# Altium schematic symbol library Блоки трансформаторов импульсных.SCHLIB: 325 symbols (part 1 of 2) (continued)
## БТИ3-66 (continued)
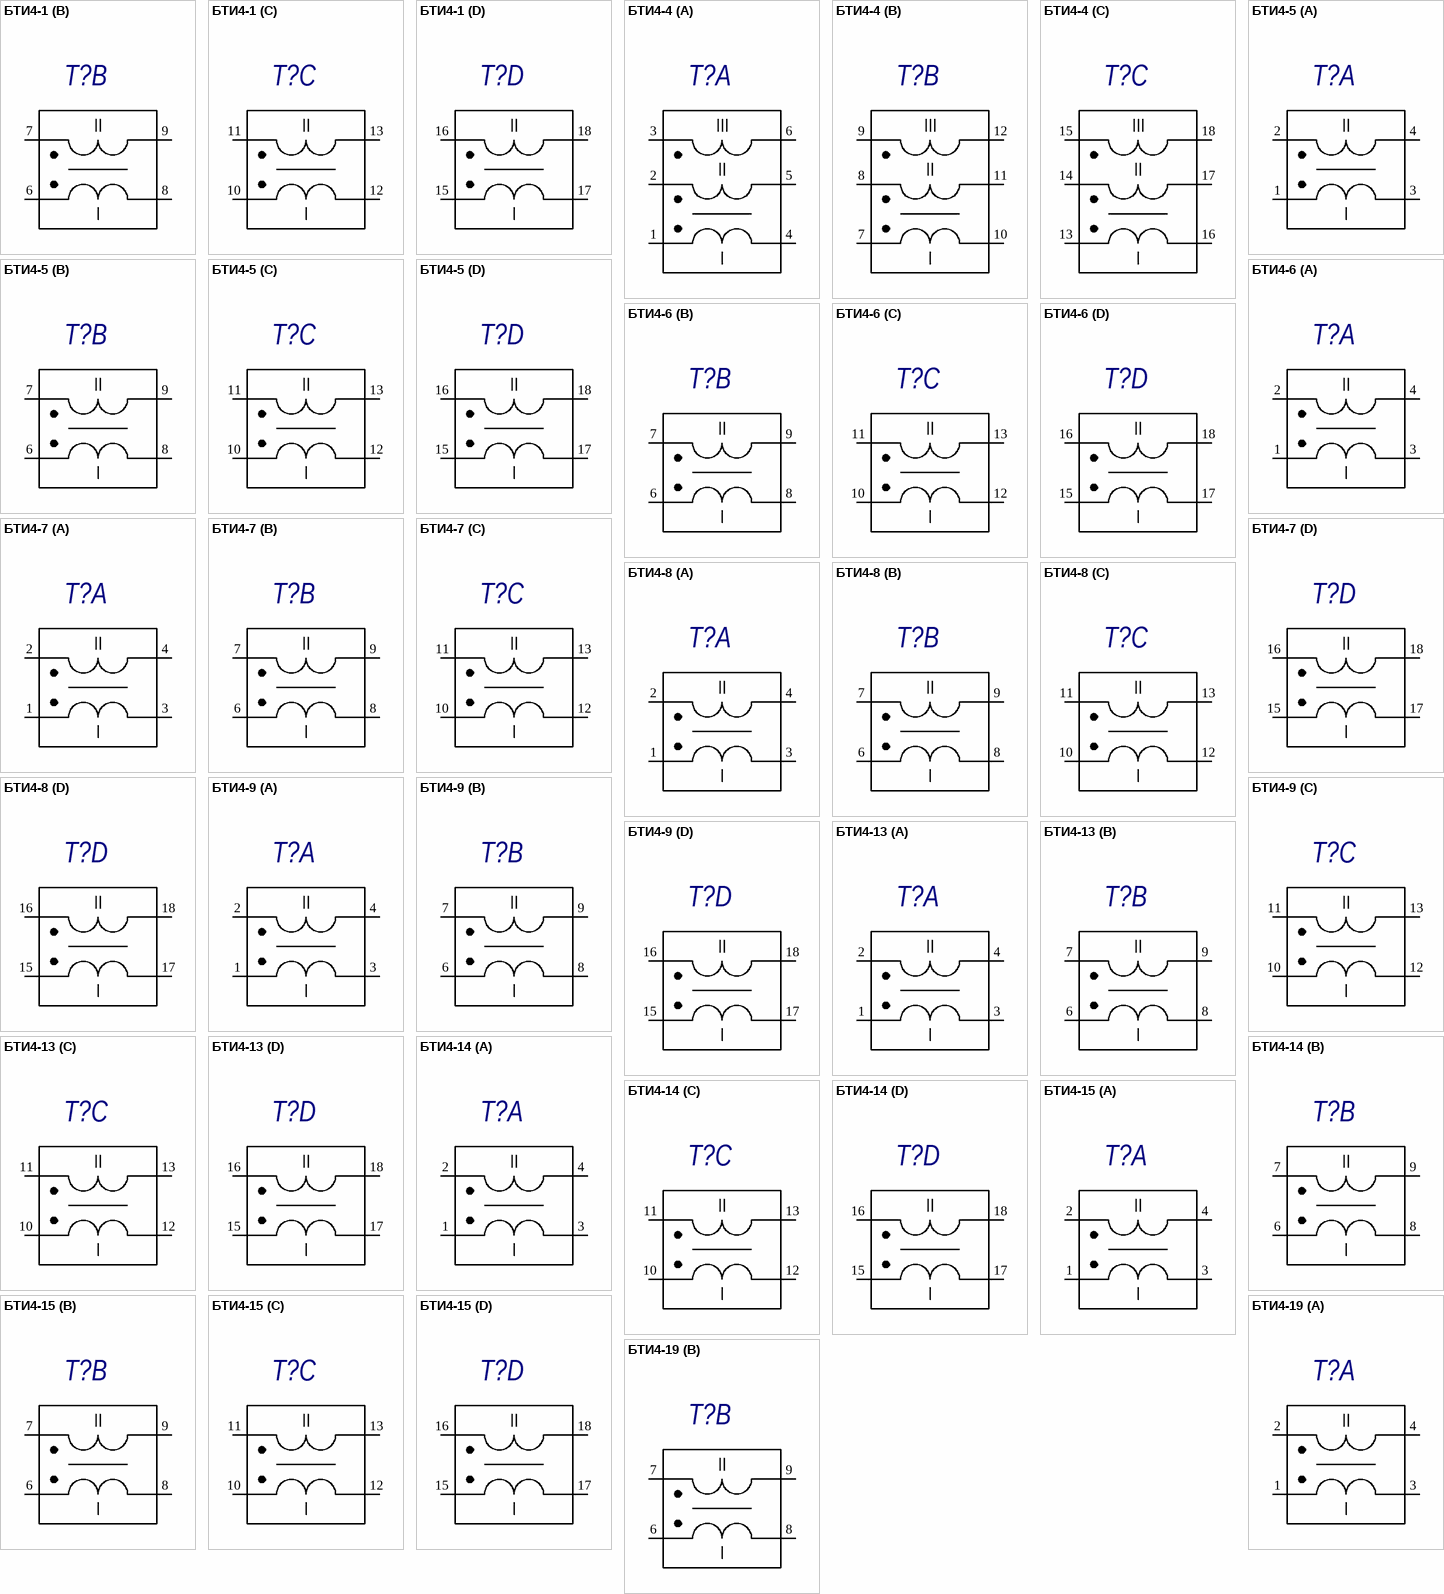
[diagram p11: symbols БТИ4-1 to БТИ4-19]
part A text: III; II; I
part B text: III; II; I
part C text: III; II; I
part D text: III; II; I

## БТИ4-1
designator T?
БТИ4; Manufacturer: ПАО  «МСТАТОР»; ManufacturerCountry: Россия; Value: {Value}; Наименование элемента: Дроссель; Category: Трансформатор; ComponentLink1Description: Manufacturer Link
footprint БТИ4
part A pins: 1, 2, 3, 4
part B pins: 6, 7, 8, 9
part C pins: 10, 11, 12, 13
part D pins: 15, 16, 17, 18 8
part A text: II; I
part B text: II; I
part C text: II; I
part D text: II; I

## БТИ4-4
designator T?
БТИ4; Manufacturer: ПАО  «МСТАТОР»; ManufacturerCountry: Россия; Value: {Value}; Наименование элемента: Дроссель; Category: Трансформатор; ComponentLink1Description: Manufacturer Link
footprint БТИ4
part A pins: 1, 2, 3, 4, 5, 6
part B pins: 7, 8, 9, 10, 11, 12
part C pins: 13, 14, 15, 16, 17, 18
part A text: III; II; I
part B text: III; II; I
part C text: III; II; I

## БТИ4-5
designator T?
БТИ4; Manufacturer: ПАО  «МСТАТОР»; ManufacturerCountry: Россия; Value: {Value}; Наименование элемента: Дроссель; Category: Трансформатор; ComponentLink1Description: Manufacturer Link
footprint БТИ4
part A pins: 1, 2, 3, 4
part B pins: 6, 7, 8, 9
part C pins: 10, 11, 12, 13
part D pins: 15, 16, 17, 18 8
part A text: II; I
part B text: II; I
part C text: II; I
part D text: II; I

## БТИ4-6
designator T?
БТИ4; Manufacturer: ПАО  «МСТАТОР»; ManufacturerCountry: Россия; Value: {Value}; Наименование элемента: Дроссель; Category: Трансформатор; ComponentLink1Description: Manufacturer Link
footprint БТИ4
part A pins: 1, 2, 3, 4
part B pins: 6, 7, 8, 9
part C pins: 10, 11, 12, 13
part D pins: 15, 16, 17, 18 8
part A text: II; I
part B text: II; I
part C text: II; I
part D text: II; I

## БТИ4-7
designator T?
БТИ4; Manufacturer: ПАО  «МСТАТОР»; ManufacturerCountry: Россия; Value: {Value}; Наименование элемента: Дроссель; Category: Трансформатор; ComponentLink1Description: Manufacturer Link
footprint БТИ4
part A pins: 1, 2, 3, 4
part B pins: 6, 7, 8, 9
part C pins: 10, 11, 12, 13
part D pins: 15, 16, 17, 18 8
part A text: II; I
part B text: II; I
part C text: II; I
part D text: II; I

## БТИ4-8
designator T?
БТИ4; Manufacturer: ПАО  «МСТАТОР»; ManufacturerCountry: Россия; Value: {Value}; Наименование элемента: Дроссель; Category: Трансформатор; ComponentLink1Description: Manufacturer Link
footprint БТИ4
part A pins: 1, 2, 3, 4
part B pins: 6, 7, 8, 9
part C pins: 10, 11, 12, 13
part D pins: 15, 16, 17, 18 8
part A text: II; I
part B text: II; I
part C text: II; I
part D text: II; I

## БТИ4-9
designator T?
БТИ4; Manufacturer: ПАО  «МСТАТОР»; ManufacturerCountry: Россия; Value: {Value}; Наименование элемента: Дроссель; Category: Трансформатор; ComponentLink1Description: Manufacturer Link
footprint БТИ4
part A pins: 1, 2, 3, 4
part B pins: 6, 7, 8, 9
part C pins: 10, 11, 12, 13
part D pins: 15, 16, 17, 18 8
part A text: II; I
part B text: II; I
part C text: II; I
part D text: II; I

## БТИ4-13
designator T?
БТИ4; Manufacturer: ПАО  «МСТАТОР»; ManufacturerCountry: Россия; Value: {Value}; Наименование элемента: Дроссель; Category: Трансформатор; ComponentLink1Description: Manufacturer Link
footprint БТИ4
part A pins: 1, 2, 3, 4
part B pins: 6, 7, 8, 9
part C pins: 10, 11, 12, 13
part D pins: 15, 16, 17, 18 8
part A text: II; I
part B text: II; I
part C text: II; I
part D text: II; I

## БТИ4-14
designator T?
БТИ4; Manufacturer: ПАО  «МСТАТОР»; ManufacturerCountry: Россия; Value: {Value}; Наименование элемента: Дроссель; Category: Трансформатор; ComponentLink1Description: Manufacturer Link
footprint БТИ4
part A pins: 1, 2, 3, 4
part B pins: 6, 7, 8, 9
part C pins: 10, 11, 12, 13
part D pins: 15, 16, 17, 18 8
part A text: II; I
part B text: II; I
part C text: II; I
part D text: II; I

## БТИ4-15
designator T?
БТИ4; Manufacturer: ПАО  «МСТАТОР»; ManufacturerCountry: Россия; Value: {Value}; Наименование элемента: Дроссель; Category: Трансформатор; ComponentLink1Description: Manufacturer Link
footprint БТИ4
part A pins: 1, 2, 3, 4
part B pins: 6, 7, 8, 9
part C pins: 10, 11, 12, 13
part D pins: 15, 16, 17, 18 8
part A text: II; I
part B text: II; I
part C text: II; I
part D text: II; I

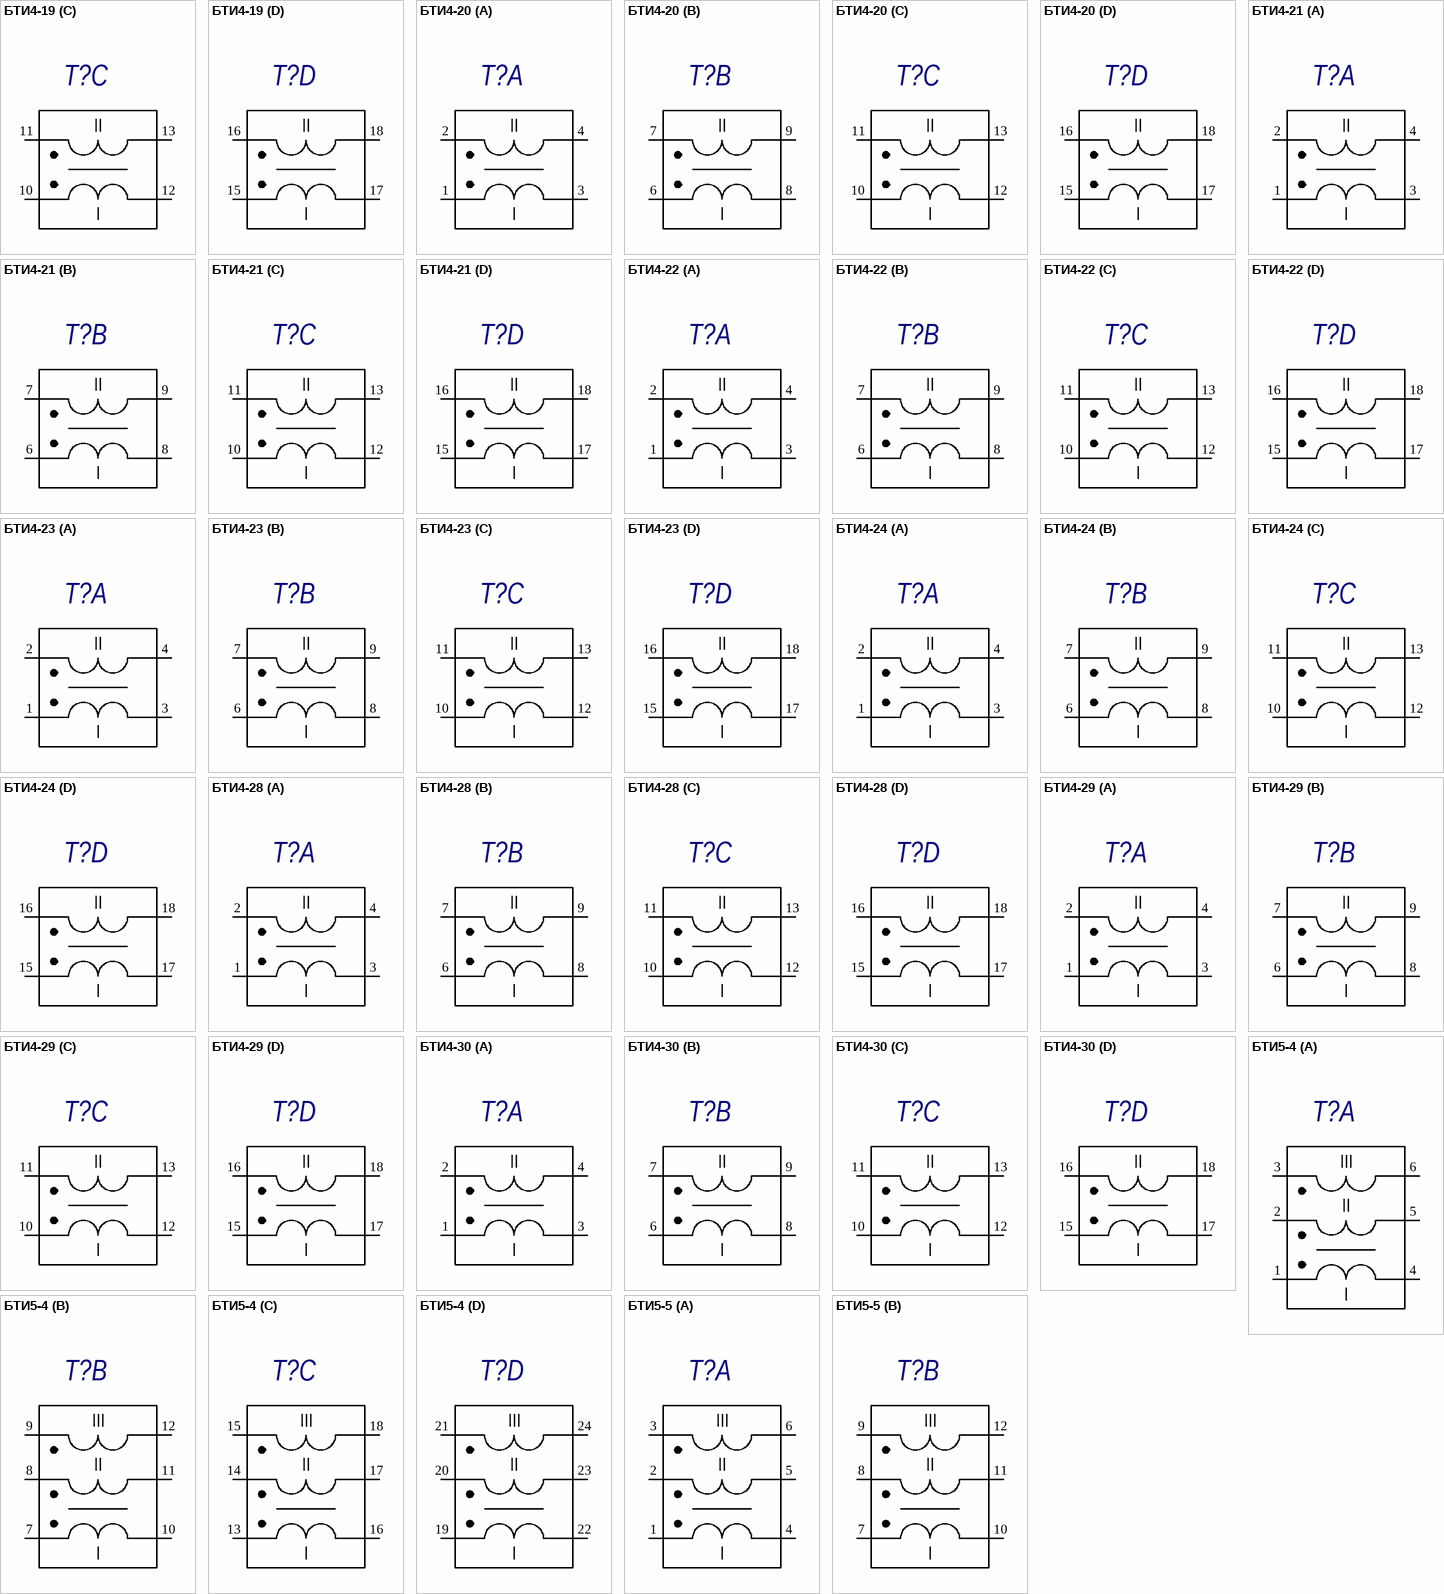
[diagram p12: symbols БТИ4-19 to БТИ5-5]

## БТИ4-19
designator T?
БТИ4; Manufacturer: ПАО  «МСТАТОР»; ManufacturerCountry: Россия; Value: {Value}; Наименование элемента: Дроссель; Category: Трансформатор; ComponentLink1Description: Manufacturer Link
footprint БТИ4
part A pins: 1, 2, 3, 4
part B pins: 6, 7, 8, 9
part C pins: 10, 11, 12, 13
part D pins: 15, 16, 17, 18 8
part A text: II; I
part B text: II; I
part C text: II; I
part D text: II; I

## БТИ4-20
designator T?
БТИ4; Manufacturer: ПАО  «МСТАТОР»; ManufacturerCountry: Россия; Value: {Value}; Наименование элемента: Дроссель; Category: Трансформатор; ComponentLink1Description: Manufacturer Link
footprint БТИ4
part A pins: 1, 2, 3, 4
part B pins: 6, 7, 8, 9
part C pins: 10, 11, 12, 13
part D pins: 15, 16, 17, 18 8
part A text: II; I
part B text: II; I
part C text: II; I
part D text: II; I

## БТИ4-21
designator T?
БТИ4; Manufacturer: ПАО  «МСТАТОР»; ManufacturerCountry: Россия; Value: {Value}; Наименование элемента: Дроссель; Category: Трансформатор; ComponentLink1Description: Manufacturer Link
footprint БТИ4
part A pins: 1, 2, 3, 4
part B pins: 6, 7, 8, 9
part C pins: 10, 11, 12, 13
part D pins: 15, 16, 17, 18 8
part A text: II; I
part B text: II; I
part C text: II; I
part D text: II; I

## БТИ4-22
designator T?
БТИ4; Manufacturer: ПАО  «МСТАТОР»; ManufacturerCountry: Россия; Value: {Value}; Наименование элемента: Дроссель; Category: Трансформатор; ComponentLink1Description: Manufacturer Link
footprint БТИ4
part A pins: 1, 2, 3, 4
part B pins: 6, 7, 8, 9
part C pins: 10, 11, 12, 13
part D pins: 15, 16, 17, 18 8
part A text: II; I
part B text: II; I
part C text: II; I
part D text: II; I

## БТИ4-23
designator T?
БТИ4; Manufacturer: ПАО  «МСТАТОР»; ManufacturerCountry: Россия; Value: {Value}; Наименование элемента: Дроссель; Category: Трансформатор; ComponentLink1Description: Manufacturer Link
footprint БТИ4
part A pins: 1, 2, 3, 4
part B pins: 6, 7, 8, 9
part C pins: 10, 11, 12, 13
part D pins: 15, 16, 17, 18 8
part A text: II; I
part B text: II; I
part C text: II; I
part D text: II; I

## БТИ4-24
designator T?
БТИ4; Manufacturer: ПАО  «МСТАТОР»; ManufacturerCountry: Россия; Value: {Value}; Наименование элемента: Дроссель; Category: Трансформатор; ComponentLink1Description: Manufacturer Link
footprint БТИ4
part A pins: 1, 2, 3, 4
part B pins: 6, 7, 8, 9
part C pins: 10, 11, 12, 13
part D pins: 15, 16, 17, 18 8
part A text: II; I
part B text: II; I
part C text: II; I
part D text: II; I

## БТИ4-28
designator T?
БТИ4; Manufacturer: ПАО  «МСТАТОР»; ManufacturerCountry: Россия; Value: {Value}; Наименование элемента: Дроссель; Category: Трансформатор; ComponentLink1Description: Manufacturer Link
footprint БТИ4
part A pins: 1, 2, 3, 4
part B pins: 6, 7, 8, 9
part C pins: 10, 11, 12, 13
part D pins: 15, 16, 17, 18 8
part A text: II; I
part B text: II; I
part C text: II; I
part D text: II; I

## БТИ4-29
designator T?
БТИ4; Manufacturer: ПАО  «МСТАТОР»; ManufacturerCountry: Россия; Value: {Value}; Наименование элемента: Дроссель; Category: Трансформатор; ComponentLink1Description: Manufacturer Link
footprint БТИ4
part A pins: 1, 2, 3, 4
part B pins: 6, 7, 8, 9
part C pins: 10, 11, 12, 13
part D pins: 15, 16, 17, 18 8
part A text: II; I
part B text: II; I
part C text: II; I
part D text: II; I

## БТИ4-30
designator T?
БТИ4; Manufacturer: ПАО  «МСТАТОР»; ManufacturerCountry: Россия; Value: {Value}; Наименование элемента: Дроссель; Category: Трансформатор; ComponentLink1Description: Manufacturer Link
footprint БТИ4
part A pins: 1, 2, 3, 4
part B pins: 6, 7, 8, 9
part C pins: 10, 11, 12, 13
part D pins: 15, 16, 17, 18 8
part A text: II; I
part B text: II; I
part C text: II; I
part D text: II; I

## БТИ5-4
designator T?
БТИ5; Manufacturer: ПАО  «МСТАТОР»; ManufacturerCountry: Россия; Value: {Value}; Наименование элемента: Дроссель; Category: Трансформатор; ComponentLink1Description: Manufacturer Link
footprint БТИ5
part A pins: 1, 2, 3, 4, 5, 6
part B pins: 7, 8, 9, 10, 11, 12
part C pins: 13, 14, 15, 16, 17, 18
part D pins: 19, 20, 21, 22, 23, 24
part A text: III; II; I
part B text: III; II; I
part C text: III; II; I
part D text: III; II; I

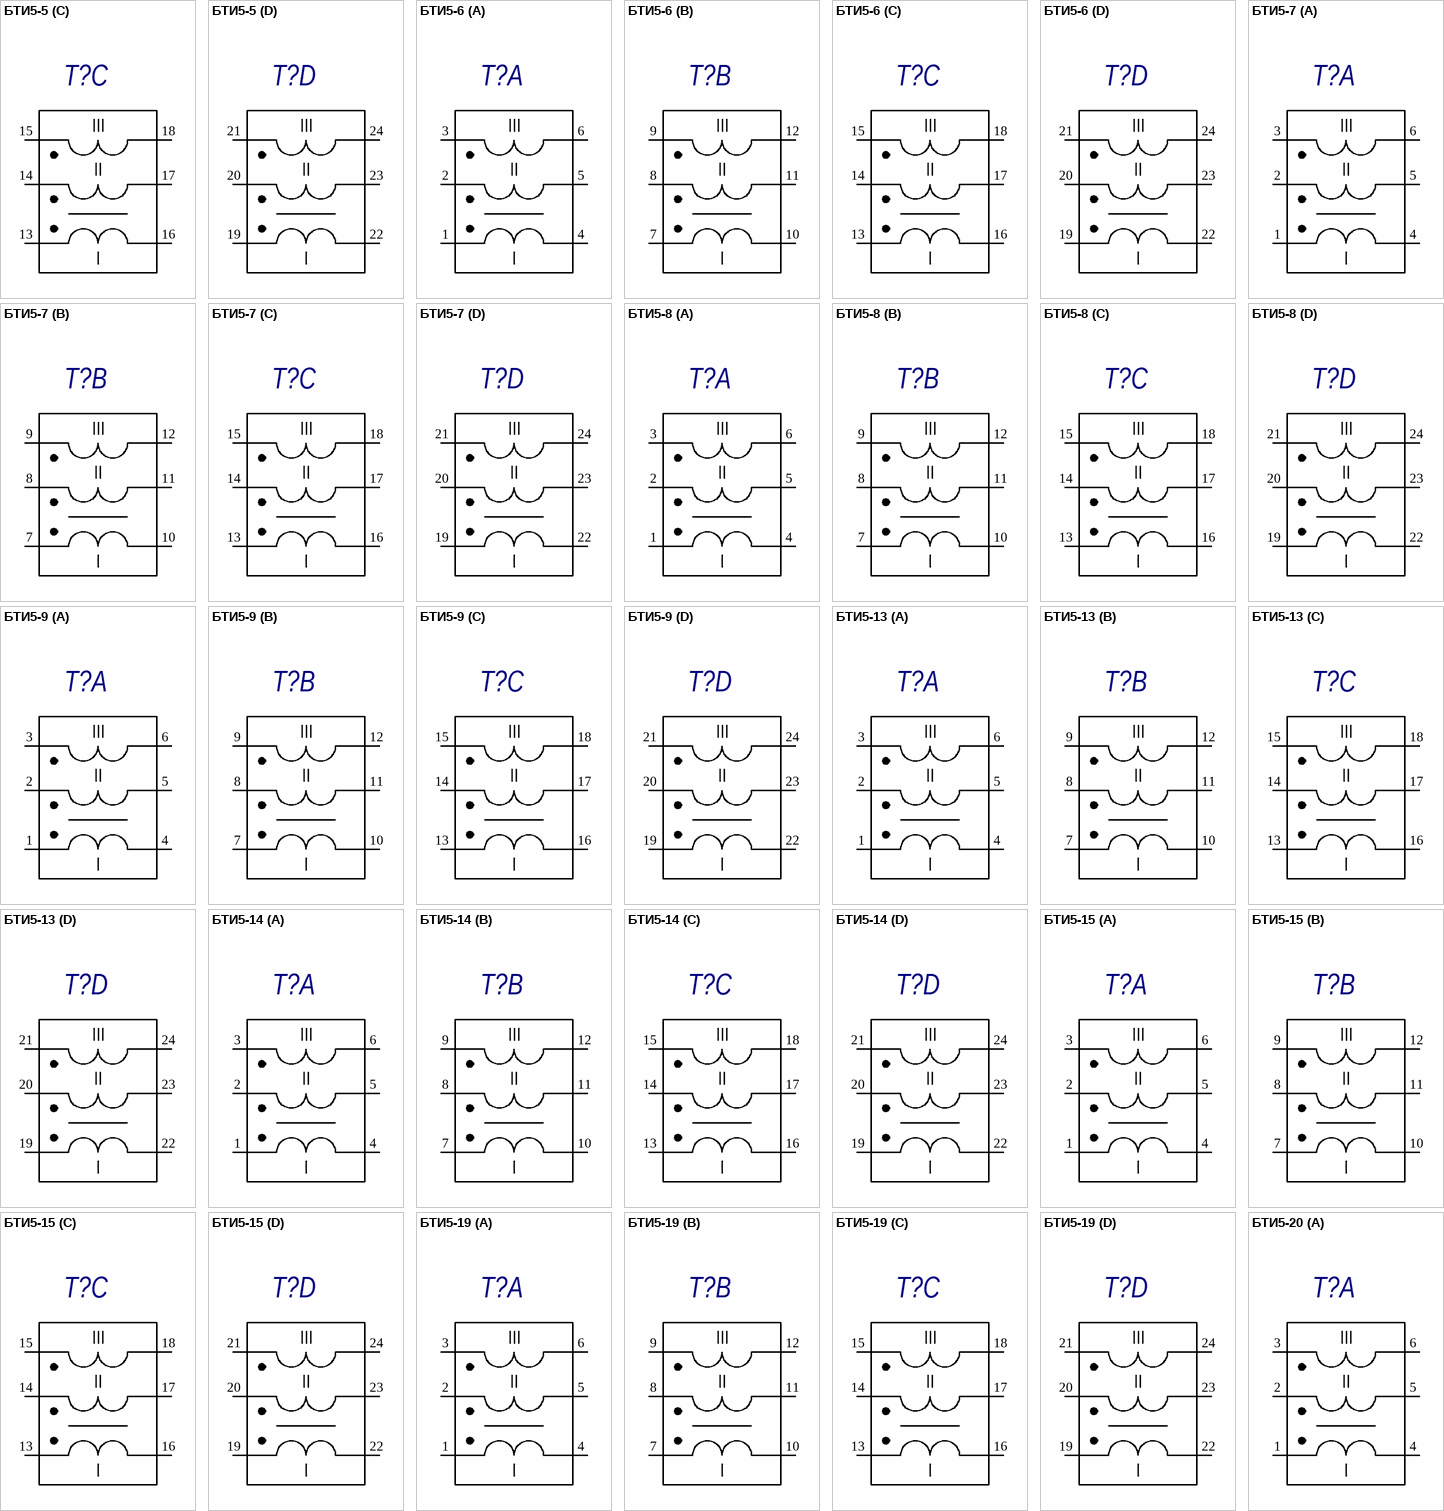
[diagram p13: symbols БТИ5-5 to БТИ5-20]

## БТИ5-5
designator T?
БТИ5; Manufacturer: ПАО  «МСТАТОР»; ManufacturerCountry: Россия; Value: {Value}; Наименование элемента: Дроссель; Category: Трансформатор; ComponentLink1Description: Manufacturer Link
footprint БТИ5
part A pins: 1, 2, 3, 4, 5, 6
part B pins: 7, 8, 9, 10, 11, 12
part C pins: 13, 14, 15, 16, 17, 18
part D pins: 19, 20, 21, 22, 23, 24
part A text: III; II; I
part B text: III; II; I
part C text: III; II; I
part D text: III; II; I

## БТИ5-6
designator T?
БТИ5; Manufacturer: ПАО  «МСТАТОР»; ManufacturerCountry: Россия; Value: {Value}; Наименование элемента: Дроссель; Category: Трансформатор; ComponentLink1Description: Manufacturer Link
footprint БТИ5
part A pins: 1, 2, 3, 4, 5, 6
part B pins: 7, 8, 9, 10, 11, 12
part C pins: 13, 14, 15, 16, 17, 18
part D pins: 19, 20, 21, 22, 23, 24
part A text: III; II; I
part B text: III; II; I
part C text: III; II; I
part D text: III; II; I

## БТИ5-7
designator T?
БТИ5; Manufacturer: ПАО  «МСТАТОР»; ManufacturerCountry: Россия; Value: {Value}; Наименование элемента: Дроссель; Category: Трансформатор; ComponentLink1Description: Manufacturer Link
footprint БТИ5
part A pins: 1, 2, 3, 4, 5, 6
part B pins: 7, 8, 9, 10, 11, 12
part C pins: 13, 14, 15, 16, 17, 18
part D pins: 19, 20, 21, 22, 23, 24
part A text: III; II; I
part B text: III; II; I
part C text: III; II; I
part D text: III; II; I

## БТИ5-8
designator T?
БТИ5; Manufacturer: ПАО  «МСТАТОР»; ManufacturerCountry: Россия; Value: {Value}; Наименование элемента: Дроссель; Category: Трансформатор; ComponentLink1Description: Manufacturer Link
footprint БТИ5
part A pins: 1, 2, 3, 4, 5, 6
part B pins: 7, 8, 9, 10, 11, 12
part C pins: 13, 14, 15, 16, 17, 18
part D pins: 19, 20, 21, 22, 23, 24
part A text: III; II; I
part B text: III; II; I
part C text: III; II; I
part D text: III; II; I

## БТИ5-9
designator T?
БТИ5; Manufacturer: ПАО  «МСТАТОР»; ManufacturerCountry: Россия; Value: {Value}; Наименование элемента: Дроссель; Category: Трансформатор; ComponentLink1Description: Manufacturer Link
footprint БТИ5
part A pins: 1, 2, 3, 4, 5, 6
part B pins: 7, 8, 9, 10, 11, 12
part C pins: 13, 14, 15, 16, 17, 18
part D pins: 19, 20, 21, 22, 23, 24
part A text: III; II; I
part B text: III; II; I
part C text: III; II; I
part D text: III; II; I

## БТИ5-13
designator T?
БТИ5; Manufacturer: ПАО  «МСТАТОР»; ManufacturerCountry: Россия; Value: {Value}; Наименование элемента: Дроссель; Category: Трансформатор; ComponentLink1Description: Manufacturer Link
footprint БТИ5
part A pins: 1, 2, 3, 4, 5, 6
part B pins: 7, 8, 9, 10, 11, 12
part C pins: 13, 14, 15, 16, 17, 18
part D pins: 19, 20, 21, 22, 23, 24
part A text: III; II; I
part B text: III; II; I
part C text: III; II; I
part D text: III; II; I

## БТИ5-14
designator T?
БТИ5; Manufacturer: ПАО  «МСТАТОР»; ManufacturerCountry: Россия; Value: {Value}; Наименование элемента: Дроссель; Category: Трансформатор; ComponentLink1Description: Manufacturer Link
footprint БТИ5
part A pins: 1, 2, 3, 4, 5, 6
part B pins: 7, 8, 9, 10, 11, 12
part C pins: 13, 14, 15, 16, 17, 18
part D pins: 19, 20, 21, 22, 23, 24
part A text: III; II; I
part B text: III; II; I
part C text: III; II; I
part D text: III; II; I

## БТИ5-15
designator T?
БТИ5; Manufacturer: ПАО  «МСТАТОР»; ManufacturerCountry: Россия; Value: {Value}; Наименование элемента: Дроссель; Category: Трансформатор; ComponentLink1Description: Manufacturer Link
footprint БТИ5
part A pins: 1, 2, 3, 4, 5, 6
part B pins: 7, 8, 9, 10, 11, 12
part C pins: 13, 14, 15, 16, 17, 18
part D pins: 19, 20, 21, 22, 23, 24
part A text: III; II; I
part B text: III; II; I
part C text: III; II; I
part D text: III; II; I

## БТИ5-19
designator T?
БТИ5; Manufacturer: ПАО  «МСТАТОР»; ManufacturerCountry: Россия; Value: {Value}; Наименование элемента: Дроссель; Category: Трансформатор; ComponentLink1Description: Manufacturer Link
footprint БТИ5
part A pins: 1, 2, 3, 4, 5, 6
part B pins: 7, 8, 9, 10, 11, 12
part C pins: 13, 14, 15, 16, 17, 18
part D pins: 19, 20, 21, 22, 23, 24
